# Altium footprint library CD's_LIB_2018.PcbLib: 155 footprints (part 8 of 10)
Each footprint in its own frame and in the unit in brackets; x right, y up, seen from the top. Pads: shape width x height; smd on the part's side, far side on the other; paste and mask are expansions set on the pad; w line width, h text height; cw(c..) or ccw(c..) is an arc to the next point about the centre after c.
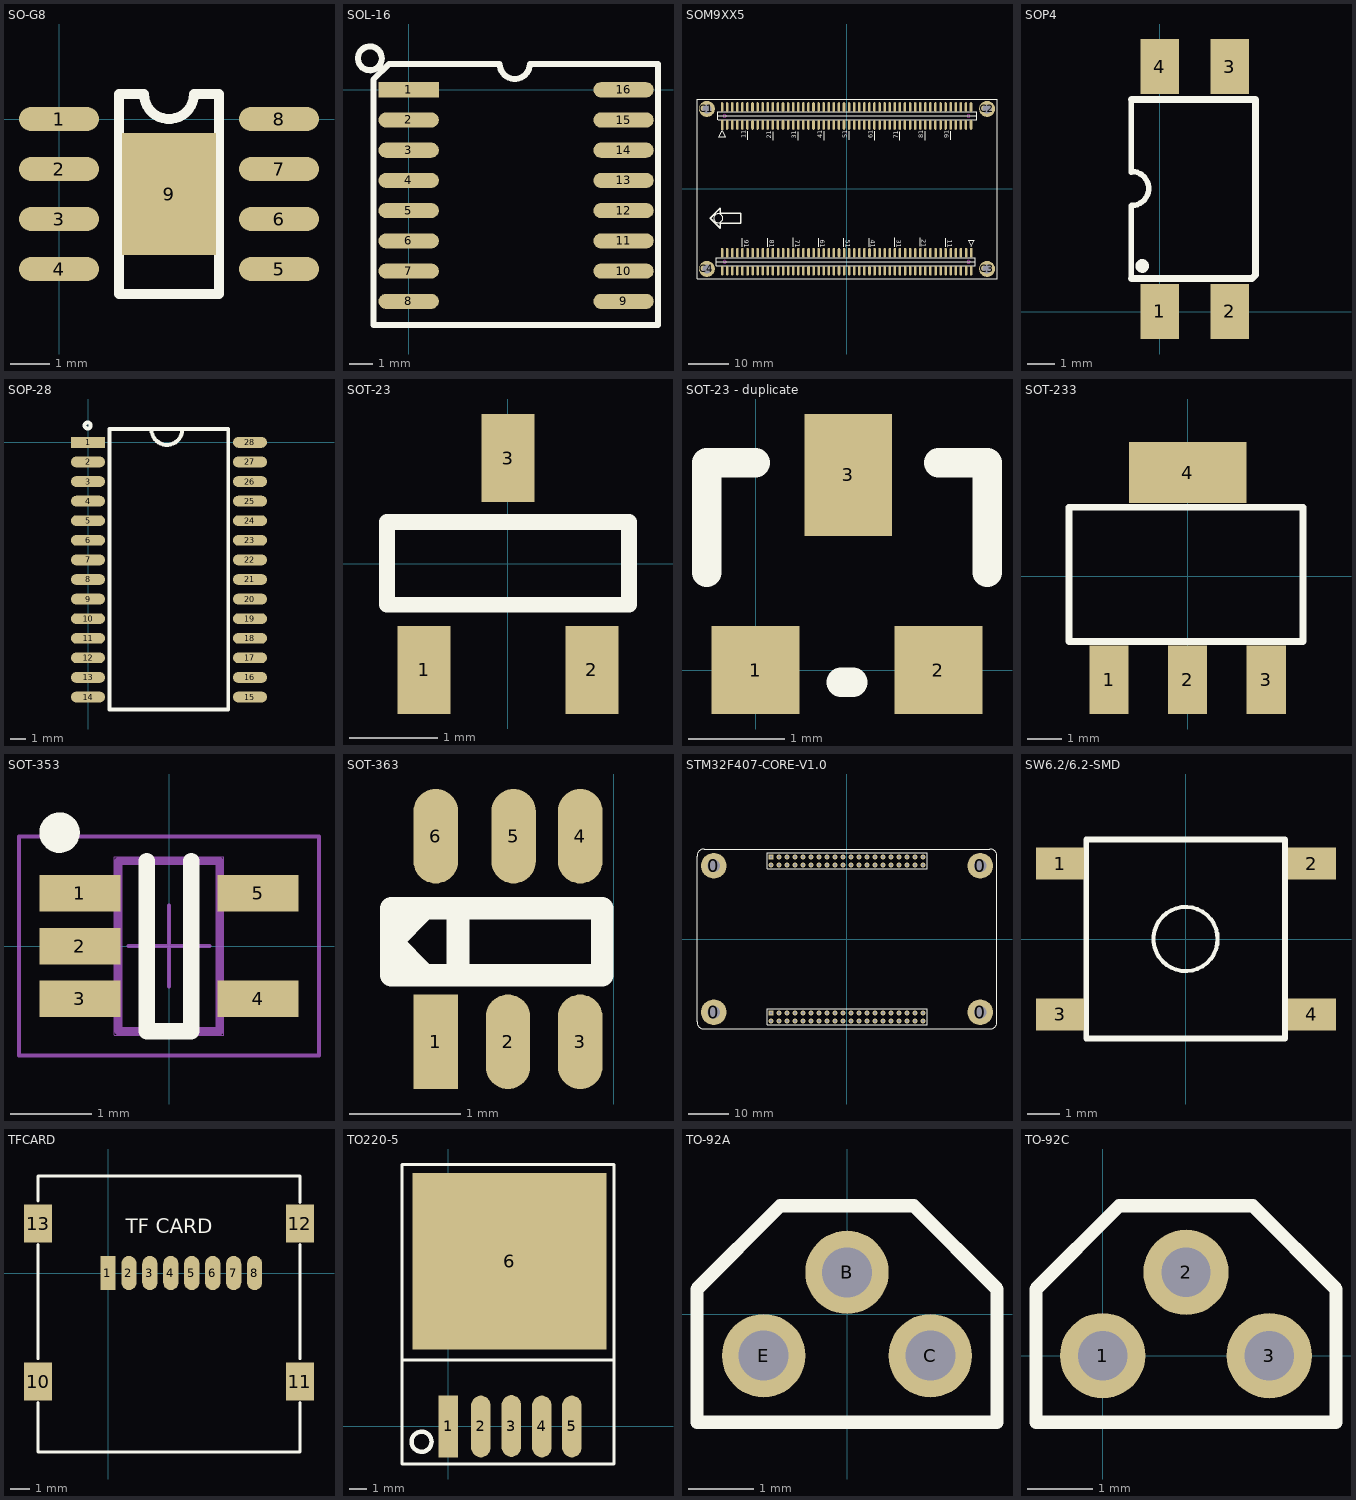
[diagram p7: the footprints below, top view; thin cyan lines are the x and y axes]

## SO-G8 [mil]
pads (9):
  oval 80x24 smd: 1(0,0) 2(0,-50) 3(0,-100) 4(0,-150) 5(220,-150) 6(220,-100) 7(220,-50) 8(220,0)
  rect 94.49x122.05 smd: 9(110,-75)
Top Overlay:
  lines w10: 60,-175 160,-175 160,25 135,25 cw(c110,25) 85,25 60,25 60,-175
3D body: height 66.93, standoff 0, extent -8.1,-171.46 228.12,21.46

## SOL-16 [mm]
pads (16):
  rect 2.54x0.635 smd: 1(0,0)
  oval 2.54x0.635 smd: 2(0,-1.27) 3(0,-2.54) 4(0,-3.81) 5(0,-5.08) 6(0,-6.35) 7(0,-7.62) 8(0,-8.89) 9(9.032,-8.891) 10(9.032,-7.621) 11(9.032,-6.351) 12(9.032,-5.081) 13(9.032,-3.811) 14(9.032,-2.541) 15(9.032,-1.271) 16(9.032,-0.001)
Top Overlay:
  circle w0.254: c-1.628,1.32 r0.5
  lines w0.254: 5.095,1.092 cw(c4.46,1.092) 3.825,1.092 -0.823,1.092 -1.484,0.431 -1.484,-9.881 10.48,-9.881 10.48,1.092 5.095,1.092
3D body: height 2.48, standoff 0, extent -0.639,-9.61 9.671,0.72

## SOM9XX5 [mil]
pads (204):
  rect 25x95 smd: A1(1221.47,-628.92) B1(-1229.53,628.92)
  oval 25x95 smd: A2(1221.47,-805.3) A3(1171.47,-628.92) A4(1171.47,-805.3) A5(1121.47,-628.92) A6(1121.47,-805.3) A7(1071.47,-628.92) A8(1071.47,-805.3) A9(1021.47,-628.92) A10(1021.47,-805.3) A11(971.47,-628.92) A12(971.47,-805.3) A13(921.47,-628.92) A14(921.47,-805.3) A15(871.47,-628.92) A16(871.47,-805.3) A17(821.47,-628.92) A18(821.47,-805.3) A19(771.47,-628.92) A20(771.47,-805.3) A21(721.47,-628.92) A22(721.47,-805.3) A23(671.47,-628.92) A24(671.47,-805.3) A25(621.47,-628.92) A26(621.47,-805.3) A27(571.47,-628.92) A28(571.47,-805.3) A29(521.47,-628.92) A30(521.47,-805.3) A31(471.47,-628.92) A32(471.47,-805.3) A33(421.47,-628.92) A34(421.47,-805.3) A35(371.47,-628.92) A36(371.47,-805.3) A37(321.47,-628.92) A38(321.47,-805.3) A39(271.47,-628.92) A40(271.47,-805.3) A41(221.47,-628.92) A42(221.47,-805.3) A43(171.47,-628.92) A44(171.47,-805.3) A45(121.47,-628.92) A46(121.47,-805.3) A47(71.47,-628.92) A48(71.47,-805.3) A49(21.47,-628.92) A50(21.47,-805.3) A51(-28.53,-628.92) A52(-28.53,-805.3) A53(-78.53,-628.92) A54(-78.53,-805.3) A55(-128.53,-628.92) A56(-128.53,-805.3) A57(-178.53,-628.92) A58(-178.53,-805.3) A59(-228.53,-628.92) A60(-228.53,-805.3) A61(-278.53,-628.92) A62(-278.53,-805.3) A63(-328.53,-628.92) A64(-328.53,-805.3) A65(-378.53,-628.92) A66(-378.53,-805.3) A67(-428.53,-628.92) A68(-428.53,-805.3) A69(-478.53,-628.92) A70(-478.53,-805.3) A71(-528.53,-628.92) A72(-528.53,-805.3) A73(-578.53,-628.92) A74(-578.53,-805.3) A75(-628.53,-628.92) A76(-628.53,-805.3) A77(-678.53,-628.92) A78(-678.53,-805.3) A79(-728.53,-628.92) A80(-728.53,-805.3) A81(-778.53,-628.92) A82(-778.53,-805.3) A83(-828.53,-628.92) A84(-828.53,-805.3) A85(-878.53,-628.92) A86(-878.53,-805.3) A87(-928.53,-628.92) A88(-928.53,-805.3) A89(-978.53,-628.92) A90(-978.53,-805.3) A91(-1028.53,-628.92) A92(-1028.53,-806.87) A93(-1078.53,-628.92) A94(-1078.53,-805.3) A95(-1128.53,-628.92) A96(-1128.53,-805.3) A97(-1178.53,-628.92) A98(-1178.53,-805.3) A99(-1228.53,-628.92) A100(-1228.53,-805.3) B2(-1229.53,805.3) B3(-1179.53,628.92) B4(-1179.53,805.3) B5(-1129.53,628.92) B6(-1129.53,805.3) B7(-1079.53,628.92) B8(-1079.53,805.3) B9(-1029.53,628.92) B10(-1029.53,805.3) B11(-979.53,628.92) B12(-979.53,805.3) B13(-929.53,628.92) B14(-929.53,805.3) B15(-879.53,628.92) B16(-879.53,805.3) B17(-829.53,628.92) B18(-829.53,805.3) B19(-779.53,628.92) B20(-779.53,805.3) B21(-729.53,628.92) B22(-729.53,805.3) B23(-679.53,628.92) B24(-679.53,805.3) B25(-629.53,628.92) B26(-629.53,805.3) B27(-579.53,628.92) B28(-579.53,805.3) B29(-529.53,628.92) B30(-529.53,805.3) B31(-479.53,628.92) B32(-479.53,805.3) B33(-429.53,628.92) B34(-429.53,805.3) B35(-379.53,628.92) B36(-379.53,805.3) B37(-329.53,628.92) B38(-329.53,805.3) B39(-279.53,628.92) B40(-279.53,805.3) B41(-229.53,628.92) B42(-229.53,805.3) B43(-179.53,628.92) B44(-179.53,805.3) B45(-129.53,628.92) B46(-129.53,805.3) B47(-79.53,628.92) B48(-79.53,805.3) B49(-29.53,628.92) B50(-29.53,805.3) B51(20.47,628.92) B52(20.47,805.3) B53(70.47,628.92) B54(70.47,805.3) B55(120.47,628.92) B56(120.47,805.3) B57(170.47,628.92) B58(170.47,805.3) B59(220.47,628.92) B60(220.47,805.3) B61(270.47,628.92) B62(270.47,805.3) B63(320.47,628.92) B64(320.47,805.3) B65(370.47,628.92) B66(370.47,805.3) B67(420.47,628.92) B68(420.47,805.3) B69(470.47,628.92) B70(470.47,805.3) B71(520.47,628.92) B72(520.47,805.3) B73(570.47,628.92) B74(570.47,805.3) B75(620.47,628.92) B76(620.47,805.3) B77(670.47,628.92) B78(670.47,805.3) B79(720.47,628.92) B80(720.47,805.3) B81(770.47,628.92) B82(770.47,805.3) B83(820.47,628.92) B84(820.47,805.3) B85(870.47,628.92) B86(870.47,805.3) B87(920.47,628.92) B88(920.47,805.3) B89(970.47,628.92) B90(970.47,805.3) B91(1020.47,628.92) B92(1020.47,806.87) B93(1070.47,628.92) B94(1070.47,805.3) B95(1120.47,628.92) B96(1120.47,805.3) B97(1170.47,628.92) B98(1170.47,805.3) B99(1220.47,628.92) B100(1220.47,805.3)
  round 157.48 hole 86.61: C1(-1377.95,786.4) C2(1377.95,786.4) C3(1377.95,-788.4) C4(-1377.95,-788.4)
Top Overlay:
  circle w10: c-1265.84,-289.02 r44.38
  lines w7: -1286.4,-718.68 1260.84,-718.68 ; -1269.53,679.18 -1269.53,757.92 ; -1268.9,679.32 1278.35,679.32 1278.35,758.06 -1268.9,758.06 ; -1268.9,718.69 1278.35,718.69 ; -1259.75,509.99 -1229.75,569.99 -1199.75,509.99 ; -1259.63,510.24 -1199.63,510.24 ; -1286.4,-758.05 1260.84,-758.05 1260.84,-679.32 -1286.4,-679.32 -1286.4,-758.05 ; 1190.91,-504.4 1220.91,-564.4 1250.91,-504.4 1190.91,-504.4
  lines w10: -1029.44,-571.8 -1029.44,-487.15 ; -978.61,481.19 -978.61,565.83 ; -778.46,-568.85 -778.46,-484.2 ; -726.64,478.23 -726.64,562.88 ; -529.44,-567.86 -529.44,-483.22 ; -478.61,479.22 -478.61,563.86 ; -279.44,-568.85 -279.44,-484.2 ; -225.66,480.2 -225.66,564.85 ; -29.44,-569.83 -29.44,-485.19 ; 21.39,481.19 21.39,565.83 ; 217.6,-568.85 217.6,-484.2 ; 271.39,480.2 271.39,564.85 ; 470.56,-567.86 470.56,-483.22 ; 521.39,479.22 521.39,563.86 ; 718.59,-566.88 718.59,-482.23 ; 770.41,480.2 770.41,564.85 ; 970.56,-569.83 970.56,-485.19 ; 1021.39,483.15 1021.39,567.8 ; -1475.84,-886.95 -1475.84,884.05 1476.16,884.05 1476.16,-886.95 -1475.84,-886.95
  lines w15: -1346.54,-288.64 -1246.54,-188.64 -1246.54,-238.64 -1046.84,-238.64 -1046.84,-338.64 -1246.54,-338.64 -1246.54,-388.64 -1346.54,-288.64
  text "91" at 1002.69,498.9 h47.24
  text "81" at 751.7,495.95 h47.24
  text "71" at 502.69,494.97 h47.24
  text "61" at 252.69,495.95 h47.24
  text "51" at 2.69,496.93 h47.24
  text "41" at -244.36,495.95 h47.24
  text "31" at -497.31,494.97 h47.24
  text "21" at -745.34,493.98 h47.24
  text "11" at -997.31,496.93 h47.24
  text "11" at 989.26,-500.93 h47.24
  text "21" at 737.29,-497.98 h47.24
  text "31" at 489.26,-498.96 h47.24
  text "41" at 236.3,-499.95 h47.24
  text "51" at -10.74,-500.93 h47.24
  text "61" at -260.74,-499.95 h47.24
  text "71" at -510.74,-498.96 h47.24
  text "81" at -759.76,-499.95 h47.24
  text "91" at -1010.74,-502.9 h47.24
Keep-Out Layer:
  circle w8: c-1203.53,-717.11 r14.57
  circle w8: c1196.47,-717.11 r14.57
  circle w8: c-1204.53,717.11 r14.57
  circle w8: c1195.47,717.11 r14.57
3D body: height 177.17, standoff 0, extent -1254,611 -4,827.54
3D body: height 177.17, standoff 0, extent -4,611 1246,827.54
3D body: height 177.17, standoff 0, extent -3,-827.27 1246.99,-610.73
3D body: height 177.17, standoff 0, extent -1253,-827.27 -3,-610.73

## SOP4 [mm]
pads (4):
  rect 1.4x2 smd: 1(-0.002,0.011) 2(2.538,0.011) 3(2.538,8.901) 4(-0.002,8.901)
Top Overlay:
  circle w0.25: c-0.635,1.662 r0.125
  lines w0.2: -1.028,1.206 -1.028,3.839 ; -1.028,5.073 -1.028,7.706 ; -1.018,3.858 ccw(c-1.018,4.475) -1.018,5.091
  lines w0.254: -1.028,1.206 3.352,1.206 3.479,1.333 3.479,7.706 -1.028,7.706
3D body: height 3.75, standoff -0.01, extent -1.041,-0.635 3.556,9.525

## SOP-28 [mm]
pads (28):
  rect 2.2x0.7 smd: 1(0,0)
  oval 2.2x0.7 smd: 2(0,-1.27) 3(0,-2.54) 4(0,-3.81) 5(0,-5.08) 6(0,-6.35) 7(0,-7.62) 8(0,-8.89) 9(0,-10.16) 10(0,-11.43) 11(0,-12.7) 12(0,-13.97) 13(0,-15.24) 14(0,-16.51) 15(10.5,-16.51) 16(10.5,-15.24) 17(10.5,-13.97) 18(10.5,-12.7) 19(10.5,-11.43) 20(10.5,-10.16) 21(10.5,-8.89) 22(10.5,-7.62) 23(10.5,-6.35) 24(10.5,-5.08) 25(10.5,-3.81) 26(10.5,-2.54) 27(10.5,-1.27) 28(10.5,0)
Top Overlay:
  circle w0.25: c-0.025,1.092 r0.2
  lines w0.245: 1.397,-17.323 9.093,-17.323 9.093,0.864 1.397,0.864 1.397,-17.323
  lines w0.254: 4.115,0.838 ccw(c5.115,0.838) 6.115,0.838
3D body: height 2.64, standoff 0, extent -0.103,-17.267 10.567,0.813

## SOT-23 [mm]
pads (3):
  rect 0.6x1 smd: 1(-0.95,-1.2) 2(0.95,-1.2) 3(0,1.2)
Top Overlay:
  lines w0.178: -1.372,-0.463 -1.372,0.476 1.372,0.476 1.372,-0.463 -1.372,-0.463
3D body: height 1.2, standoff 0, extent -1.45,-1.4 1.45,1.4

## SOT-23 - duplicate [mil]
pads (3):
  rect 36x36 smd: 1(0,0) 2(75,0)
  rect 36x50 smd: 3(38,80)
Top Overlay:
  lines w12: -20,40 -20,85 0,85 ; 35,-5 40,-5 ; 75,85 95,85 95,40
3D body: height 47.24, standoff 0, extent -19.58,-11.11 94.59,99.12

## SOT-233 [mil]
pads (4):
  rect 45x78.74 smd: 1(-90.55,-119.5) 2(0,-119.5) 3(90.55,-119.5)
  rect 135x70 smd: 4(0,119.5)
Top Overlay:
  lines w8: -136.98,-75.5 133.02,-75.5 133.02,79.5 -136.98,79.5 -136.98,-75.5
3D body: height 66.93, standoff 0, extent -127.95,-137 127.96,137.01

## SOT-353 [mm]
height 1.1
pads (5):
  rect 1x0.45 smd: 1(-1.1,0.65) 2(-1.1,0) 3(-1.1,-0.65) 4(1.1,-0.65) 5(1.1,0.65)
Top Overlay:
  circle w0.25: c-1.35,1.4 r0.125
  lines w0.2: -0.275,1.05 -0.275,-1.05 0.275,-1.05 0.275,1.05
Mechanical 1:
  lines w0.1: -0.625,-1.05 0.625,-1.05 0.625,1.05 -0.625,1.05 -0.625,-1.05
Mechanical 16:
  lines w0.001: -0.675,-1.1 0.675,-1.1 0.675,1.1 -0.675,1.1 -0.675,-1.1
  lines w0.05: -0.5,0 0.5,0 ; 0,-0.5 0,0.5 ; -1.85,-1.35 1.85,-1.35 1.85,1.35 -1.85,1.35 -1.85,-1.35

## SOT-363 [mm]
pads (6):
  rect 0.4x0.85 smd: 1(-1.6,-3.2)
  oval 0.4x0.85 smd: 2(-0.95,-3.2) 3(-0.3,-3.2) 4(-0.3,-1.35) 5(-0.9,-1.35) 6(-1.6,-1.35)
Top Overlay:
  lines w0.203: -1.7,-2 -2,-2.3 -1.7,-2.6 -1.6,-2.6 ; -1.4,-2.6 -1.4,-2 ; -2,-2.6 -0.1,-2.6 -0.1,-2 -2,-2 -2,-2.6

## STM32F407-CORE-V1.0 [mm] "F407核心板-V1.0"
pads (84):
  round 6.4 hole 3.2: 0(-33.3,-18.3) 0(-33.3,18.3) 0(33.3,-18.3) 0(33.3,18.3)
  rect 1.2x1.2 hole 0.75: 1(-19,20.5) 41(-19,-18.5)
  round 1.2 hole 0.75: 2(-19,18.5) 3(-17,20.5) 4(-17,18.5) 5(-15,20.5) 6(-15,18.5) 7(-13,20.5) 8(-13,18.5) 9(-11,20.5) 10(-11,18.5) 11(-9,20.5) 12(-9,18.5) 13(-7,20.5) 14(-7,18.5) 15(-5,20.5) 16(-5,18.5) 17(-3,20.5) 18(-3,18.5) 19(-1,20.5) 20(-1,18.5) 21(1,20.5) 22(1,18.5) 23(3,20.5) 24(3,18.5) 25(5,20.5) 26(5,18.5) 27(7,20.5) 28(7,18.5) 29(9,20.5) 30(9,18.5) 31(11,20.5) 32(11,18.5) 33(13,20.5) 34(13,18.5) 35(15,20.5) 36(15,18.5) 37(17,20.5) 38(17,18.5) 39(19,20.5) 40(19,18.5) 42(-19,-20.5) 43(-17,-18.5) 44(-17,-20.5) 45(-15,-18.5) 46(-15,-20.5) 47(-13,-18.5) 48(-13,-20.5) 49(-11,-18.5) 50(-11,-20.5) 51(-9,-18.5) 52(-9,-20.5) 53(-7,-18.5) 54(-7,-20.5) 55(-5,-18.5) 56(-5,-20.5) 57(-3,-18.5) 58(-3,-20.5) 59(-1,-18.5) 60(-1,-20.5) 61(1,-18.5) 62(1,-20.5) 63(3,-18.5) 64(3,-20.5) 65(5,-18.5) 66(5,-20.5) 67(7,-18.5) 68(7,-20.5) 69(9,-18.5) 70(9,-20.5) 71(11,-18.5) 72(11,-20.5) 73(13,-18.5) 74(13,-20.5) 75(15,-18.5) 76(15,-20.5) 77(17,-18.5) 78(17,-20.5) 79(19,-18.5) 80(19,-20.5)
Top Overlay:
  lines w0.2: -20,-21.5 -20,-17.5 20,-17.5 20,-21.5 -20,-21.5 ; -20,17.5 -20,21.5 20,21.5 20,17.5 -20,17.5
  lines w0.254: -37.5,-20.7 ccw(c-35.7,-20.7) -35.7,-22.5 35.7,-22.5 ccw(c35.7,-20.7) 37.5,-20.7 37.5,20.7 ccw(c35.7,20.7) 35.7,22.5 -35.7,22.5 ccw(c-35.7,20.7) -37.5,20.7 -37.5,-20.7

## SW6.2/6.2-SMD [mm]
pads (4):
  rect 1.5x1 smd: 1(-3.912,2.35) 2(3.937,2.35) 3(-3.912,-2.35) 4(3.937,-2.35)
Top Overlay:
  circle w0.127: c0,0 r1
  lines w0.178: -3.1,-3.1 3.1,-3.1 3.1,3.1 -3.1,3.1 -3.1,-3.1

## TFCARD [mm]
pads (12):
  rect 0.8x1.8 smd: 1(-0.009,-0.001)
  oval 0.8x1.8 smd: 2(1.091,-0.001) 3(2.191,-0.001) 4(3.291,-0.001) 5(4.391,-0.001) 6(5.491,-0.001) 7(6.591,-0.001) 8(7.691,-0.001)
  rect 1.45x2 smd: 10(-3.679,-5.701) 11(10.071,-5.701) 12(10.071,2.599) 13(-3.679,2.599)
Top Overlay:
  lines w0.15: -3.679,3.774 -3.679,5.099 10.071,5.099 10.071,3.699 ; 10.071,-9.401 10.071,-6.801
  lines w0.152: -3.679,-6.801 -3.679,-9.401 10.071,-9.401 ; -3.679,-4.501 -3.679,1.499 ; 10.071,-4.501 10.071,1.499
  text "TF CARD" at 0.932,2.081 h0.76

## TO220-5 [mm]
pads (6):
  rect 1.1x3.5 smd: 1(0,-0.025)
  oval 1.1x3.5 smd: 2(1.854,-0.025) 3(3.581,0) 4(5.309,-0.025) 5(7.01,-0.025)
  rect 11x10 smd: 6(3.48,9.347)
Top Overlay:
  circle w0.254: c-1.508,-0.889 r0.568
  lines w0.178: -2.608,3.738 9.392,3.738 ; 9.392,-1.726 9.392,14.374 9.392,14.825 -2.608,14.825 -2.608,14.374 -2.608,-1.626 -2.608,-2.151 9.39,-2.151 9.39,-1.501 9.392,-1.499

## TO-92A [mil]
pads (3):
  round 50 hole 30: B(0,25) C(50,-25) E(-50,-25)
Top Overlay:
  lines w8: -90,-65 90,-65 90,15 40,65 -40,65 -90,15 -90,-65
3D body: height 298, standoff -89.4, extent -88.97,-62.88 88.98,70.98

## TO-92C [mm]
pads (3):
  round 1.3 hole 0.75: 1(0,0) 2(1.27,1.27) 3(2.54,0)
Top Overlay:
  lines w0.203: -1.016,-1.016 -1.016,1.016 0.254,2.286 2.286,2.286 3.556,1.016 3.556,-1.016 -1.016,-1.016
3D body: height 7.57, standoff -2.27, extent -0.985,-0.96 3.535,2.44